# Altium footprint library etherceptor.PcbLib: 98 footprints (part 5 of 7)
Each footprint in its own frame and in the unit in brackets; x right, y up, seen from the top. Pads: shape width x height; smd on the part's side, far side on the other; paste and mask are expansions set on the pad; w line width, h text height; cw(c..) or ccw(c..) is an arc to the next point about the centre after c.
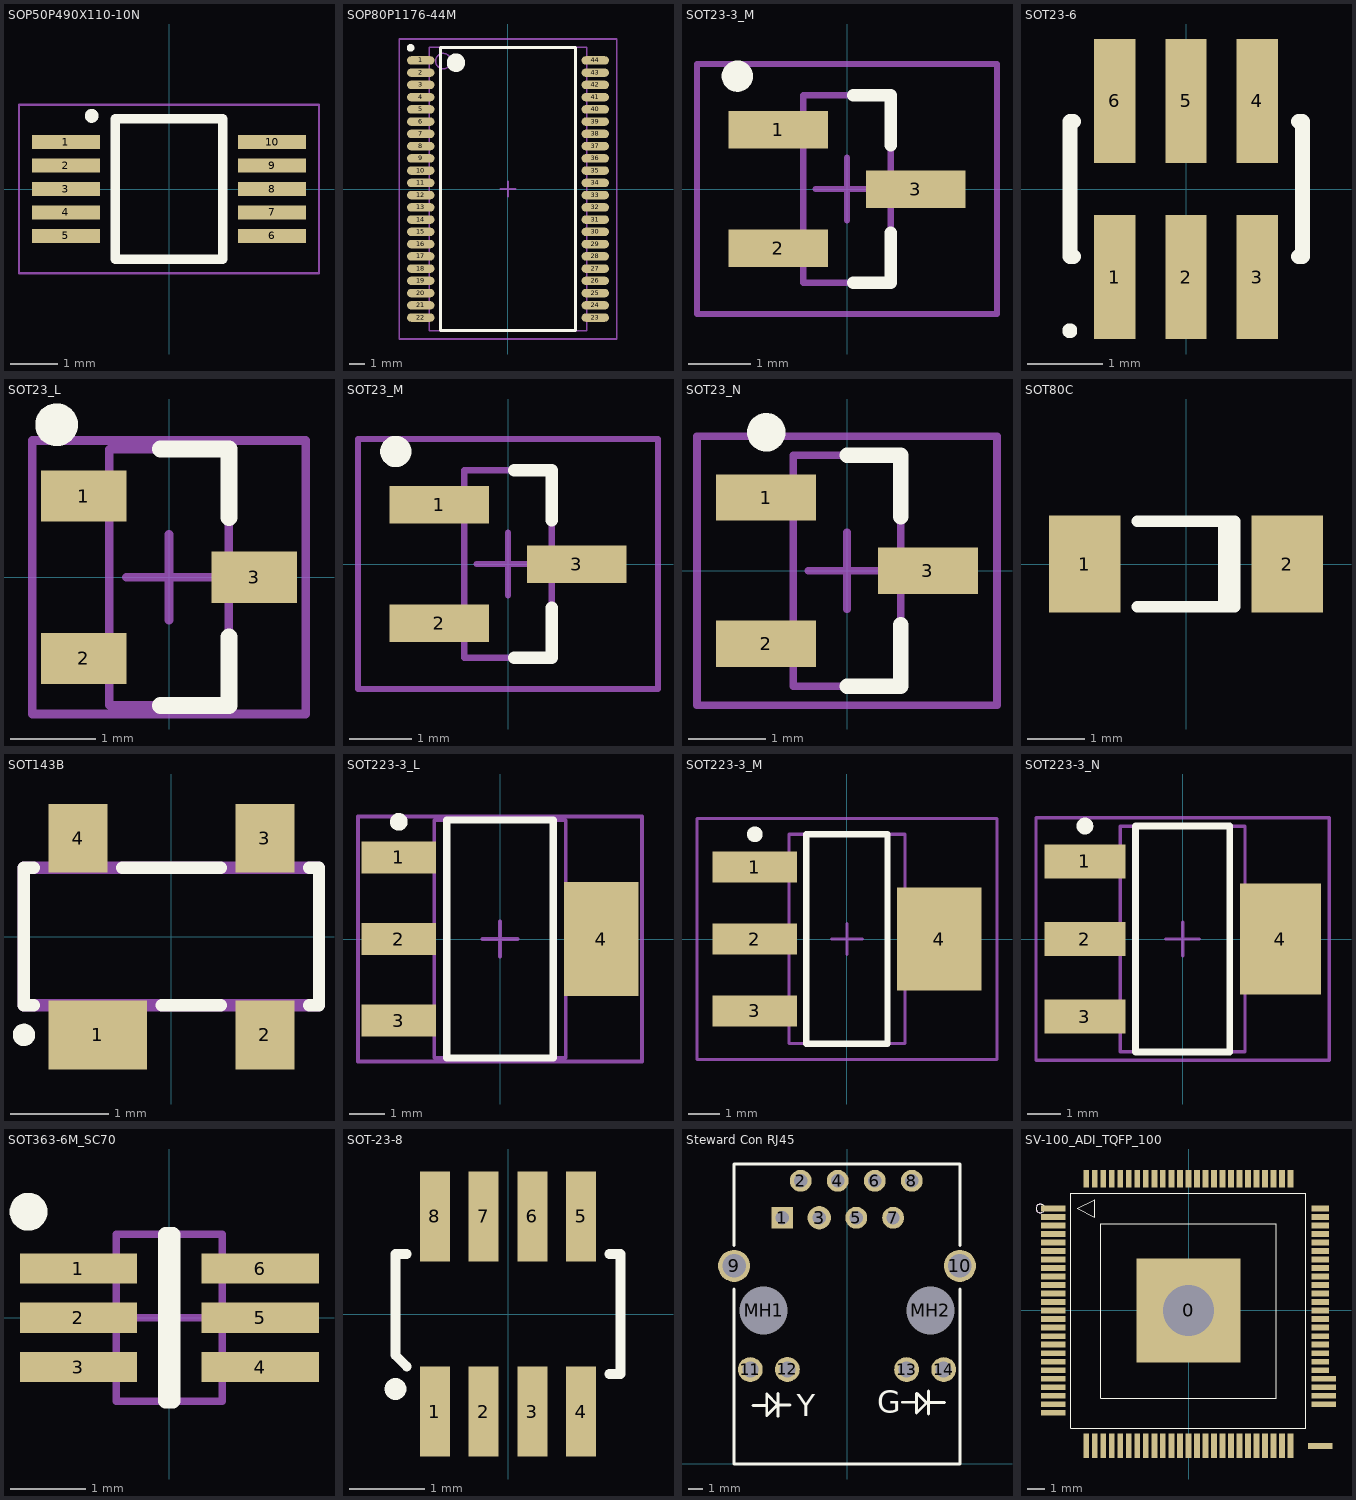
[diagram p4: the footprints below, top view; thin cyan lines are the x and y axes]

## SOP50P490X110-10N [mm]
pads (10):
  rect 1.45x0.3 smd paste-25.4 mask-25.4: 1(-2.2,1) 2(-2.2,0.5) 3(-2.2,0) 4(-2.2,-0.5) 5(-2.2,-1) 6(2.2,-1) 7(2.2,-0.5) 8(2.2,0) 9(2.2,0.5) 10(2.2,1)
Top Overlay:
  circle w0.254: c-1.65,1.56 r0.02
  lines w0.2: -1.15,-1.5 1.15,-1.5 1.15,1.5 -1.15,1.5 -1.15,-1.5
Top Paste:
  region: -2.925,0.85 -1.475,0.85 -1.475,1.15 -2.925,1.15
  region: -2.925,0.35 -1.475,0.35 -1.475,0.65 -2.925,0.65
  region: -2.925,-0.15 -1.475,-0.15 -1.475,0.15 -2.925,0.15
  region: -2.925,-0.65 -1.475,-0.65 -1.475,-0.35 -2.925,-0.35
  region: -2.925,-1.15 -1.475,-1.15 -1.475,-0.85 -2.925,-0.85
  region: 2.925,-0.85 1.475,-0.85 1.475,-1.15 2.925,-1.15
  region: 2.925,-0.35 1.475,-0.35 1.475,-0.65 2.925,-0.65
  region: 2.925,0.15 1.475,0.15 1.475,-0.15 2.925,-0.15
  region: 2.925,0.65 1.475,0.65 1.475,0.35 2.925,0.35
  region: 2.925,1.15 1.475,1.15 1.475,0.85 2.925,0.85
Top Solder:
  region: -3.025,0.75 -1.375,0.75 -1.375,1.25 -3.025,1.25
  region: -3.025,0.25 -1.375,0.25 -1.375,0.75 -3.025,0.75
  region: -3.025,-0.25 -1.375,-0.25 -1.375,0.25 -3.025,0.25
  region: -3.025,-0.75 -1.375,-0.75 -1.375,-0.25 -3.025,-0.25
  region: -3.025,-1.25 -1.375,-1.25 -1.375,-0.75 -3.025,-0.75
  region: 3.025,-0.75 1.375,-0.75 1.375,-1.25 3.025,-1.25
  region: 3.025,-0.25 1.375,-0.25 1.375,-0.75 3.025,-0.75
  region: 3.025,0.25 1.375,0.25 1.375,-0.25 3.025,-0.25
  region: 3.025,0.75 1.375,0.75 1.375,0.25 3.025,0.25
  region: 3.025,1.25 1.375,1.25 1.375,0.75 3.025,0.75
Mechanical 1:
  lines w0.05: -3.2,-1.8 3.2,-1.8 3.2,1.8 -3.2,1.8 -3.2,-1.8
3D body "User Library-MSOP10-1.STEP": height 1.09, standoff 0, extent -2.545,-1.6 2.605,1.6

## SOP80P1176-44M [mm] "SOP, 44-Leads, Body 18.4x10.16mm, Pitch 0.8mm, IPC Low Density"
height 1.2
pads (44):
  oval 1.8x0.55 smd: 1(-5.7,8.4) 2(-5.7,7.6) 3(-5.7,6.8) 4(-5.7,6) 5(-5.7,5.2) 6(-5.7,4.4) 7(-5.7,3.6) 8(-5.7,2.8) 9(-5.7,2) 10(-5.7,1.2) 11(-5.7,0.4) 12(-5.7,-0.4) 13(-5.7,-1.2) 14(-5.7,-2) 15(-5.7,-2.8) 16(-5.7,-3.6) 17(-5.7,-4.4) 18(-5.7,-5.2) 19(-5.7,-6) 20(-5.7,-6.8) 21(-5.7,-7.6) 22(-5.7,-8.4) 23(5.7,-8.4) 24(5.7,-7.6) 25(5.7,-6.8) 26(5.7,-6) 27(5.7,-5.2) 28(5.7,-4.4) 29(5.7,-3.6) 30(5.7,-2.8) 31(5.7,-2) 32(5.7,-1.2) 33(5.7,-0.4) 34(5.7,0.4) 35(5.7,1.2) 36(5.7,2) 37(5.7,2.8) 38(5.7,3.6) 39(5.7,4.4) 40(5.7,5.2) 41(5.7,6) 42(5.7,6.8) 43(5.7,7.6) 44(5.7,8.4)
Top Overlay:
  circle w0.25: c-6.365,9.225 r0.125
  circle w0.6: c-3.4,8.25 r0.3
  lines w0.2: -4.4,-9.25 -4.4,9.25 4.4,9.25 4.4,-9.25 -4.4,-9.25
Mechanical 13:
  circle w0.1: c-4.23,8.36 r0.5
  lines w0.1: -5.13,-9.26 -5.13,9.26 5.13,9.26 5.13,-9.26 -5.13,-9.26
Mechanical 15:
  lines w0.1: -0.5,0 0.5,0 ; 0,-0.5 0,0.5 ; -7.1,-9.8 -7.1,9.8 7.1,9.8 7.1,-9.8 -7.1,-9.8
3D body "SW3dPS-44L-TSOP2.STEP": height 1, standoff -0.1, extent -5.83,-9.21 5.93,9.21

## SOT23-3_M [mm] "SOT23, 3-Leads, Body 2.9x1.3mm, Pitch 0.95mm, Lead Span 2.3mm, IPC Low Density"
height 1.1
pads (3):
  rect 1.6x0.6 smd: 1(-1.1,0.95) 2(-1.1,-0.95) 3(1.1,0)
Top Overlay:
  circle w0.25: c-1.755,1.805 r0.125
  lines w0.2: 0.1,-1.5 0.7,-1.5 0.7,-0.7 ; 0.1,1.5 0.7,1.5 0.7,0.7
Mechanical 13:
  lines w0.1: -0.7,-1.5 -0.7,1.5 0.7,1.5 0.7,-1.5 -0.7,-1.5
Mechanical 15:
  lines w0.1: -0.5,0 0.5,0 ; 0,-0.5 0,0.5 ; -2.4,-2 -2.4,2 2.4,2 2.4,-2 -2.4,-2
3D body "User Library-sot23-3.STEP": height 1, standoff 0, extent -1.22,-1.46 1.12,1.46

## SOT23-6 [mm] "SOT-23/SC-74A; 6 Leads; Body 3 x 3 mm, inc. leads (LxW max)"
height 1.45
pads (6):
  rect 0.55x1.65 smd: 1(-0.95,-1.175) 2(0,-1.175) 3(0.95,-1.175) 4(0.95,1.175) 5(0,1.175) 6(-0.95,1.175)
Top Overlay:
  circle w0.1: c-1.55,-1.89 r0.05
  lines w0.2: -1.5,-0.9 -1.55,-0.9 -1.55,0.9 -1.5,0.9 ; 1.5,-0.9 1.55,-0.9 1.55,0.9 1.5,0.9
3D body "SW3dPS-SOT-23-6.STEP": height 1.09, standoff 0, extent -1.4,-1.213 1.394,1.213

## SOT23_L [mm] "SOT23, 3-Leads, Body 2.9x1.3mm, Pitch 0.95mm, Lead Span 2.3mm, IPC High Density"
height 1.1
pads (3):
  rect 1x0.6 smd: 1(-1,0.95) 2(-1,-0.95) 3(1,0)
Top Overlay:
  circle w0.25: c-1.315,1.785 r0.125
  lines w0.2: -0.1,-1.5 0.7,-1.5 0.7,-0.7 ; -0.1,1.5 0.7,1.5 0.7,0.7
Mechanical 13:
  lines w0.1: -0.7,-1.5 0.7,-1.5 0.7,1.5 -0.7,1.5 -0.7,-1.5
Mechanical 15:
  lines w0.1: -0.5,0 0.5,0 ; 0,-0.5 0,0.5 ; -1.6,-1.6 1.6,-1.6 1.6,1.6 -1.6,1.6 -1.6,-1.6
3D body: height 1.1, standoff 0, extent -0.7,-1.5 0.7,1.5

## SOT23_M [mm] "SOT23, 3-Leads, Body 2.9x1.3mm, Pitch 0.95mm, Lead Span 2.3mm, IPC Low Density"
height 1.1
pads (3):
  rect 1.6x0.6 smd: 1(-1.1,0.95) 2(-1.1,-0.95) 3(1.1,0)
Top Overlay:
  circle w0.25: c-1.795,1.8 r0.125
  lines w0.2: 0.1,-1.5 0.7,-1.5 0.7,-0.7 ; 0.1,1.5 0.7,1.5 0.7,0.7
Mechanical 13:
  lines w0.1: -0.7,-1.5 0.7,-1.5 0.7,1.5 -0.7,1.5 -0.7,-1.5
Mechanical 15:
  lines w0.1: -0.5,0 0.5,0 ; 0,-0.5 0,0.5 ; -2.4,-2 2.4,-2 2.4,2 -2.4,2 -2.4,-2
3D body "User Library-sot23-3.STEP": height 1, standoff 0, extent -1.17,-1.46 1.17,1.46

## SOT23_N [mm] "SOT23, 3-Leads, Body 2.9x1.3mm, Pitch 0.95mm, Lead Span 2.3mm, IPC Medium Density"
height 1.1
pads (3):
  rect 1.3x0.6 smd: 1(-1.05,0.95) 2(-1.05,-0.95) 3(1.05,0)
Top Overlay:
  circle w0.25: c-1.05,1.8 r0.125
  lines w0.2: 0,-1.5 0.7,-1.5 0.7,-0.7 ; 0,1.5 0.7,1.5 0.7,0.7
Mechanical 13:
  lines w0.1: -0.7,-1.5 0.7,-1.5 0.7,1.5 -0.7,1.5 -0.7,-1.5
Mechanical 15:
  lines w0.1: -0.5,0 0.5,0 ; 0,-0.5 0,0.5 ; -1.95,-1.75 1.95,-1.75 1.95,1.75 -1.95,1.75 -1.95,-1.75
3D body: height 1.1, standoff 0, extent -0.7,-1.5 0.7,1.5

## SOT80C [mm] "Metal Electrode Face (MELF) Diode; Body 3.5 x 1.6 mm (LxDia)"
height 1.6
pads (2):
  rect 1.25x1.7 smd: 1(-1.775,0) 2(1.775,0)
Top Overlay:
  lines w0.2: -0.85,-0.75 0.85,-0.75 0.85,0.75 -0.85,0.75 ; 0.66,-0.75 0.66,0.75
3D body "SW3dPS-SOD80.STEP": height 1.61, standoff 0.01, extent -1.85,-0.8 1.85,0.8

## SOT143B [mm]
pads (4):
  rect 1x0.7 smd paste-25.4 mask-25.4: 1(-0.75,-1)
  rect 0.6x0.7 smd paste-25.4 mask-25.4: 2(0.95,-1) 3(0.95,1) 4(-0.95,1)
Top Overlay:
  circle w0.127: c-1.5,-1 r0.05
  lines w0.127: -1.4,-0.7 -1.5,-0.7 -1.5,0.7 -1.4,0.7 ; -0.5,0.7 0.5,0.7 ; -0.1,-0.7 0.5,-0.7 ; 1.4,-0.7 1.5,-0.7 1.5,0.7 1.4,0.7
Top Paste:
  region: -1.25,0.65 -0.65,0.65 -0.65,1.35 -1.25,1.35
  region: 0.65,0.65 1.25,0.65 1.25,1.35 0.65,1.35
  region: 0.65,-1.35 1.25,-1.35 1.25,-0.65 0.65,-0.65
  region: -1.25,-1.35 -0.25,-1.35 -0.25,-0.65 -1.25,-0.65
Top Solder:
  region: -1.35,0.55 -0.55,0.55 -0.55,1.45 -1.35,1.45
  region: 0.55,0.55 1.35,0.55 1.35,1.45 0.55,1.45
  region: 0.55,-1.45 1.35,-1.45 1.35,-0.55 0.55,-0.55
  region: -1.35,-1.45 -0.15,-1.45 -0.15,-0.55 -1.35,-0.55
Mechanical 1:
  lines w0.127: -1.5,-0.7 -1.5,0.7 1.5,0.7 1.5,-0.7 -1.5,-0.7
3D body "User Library-SOT-143.STEP": height 1, standoff 0, extent -1.48,-1.22 1.44,1.2

## SOT223-3_L [mm] "SOT223, 4-Leads, Body 6.5x3.5mm, Pitch 2.3mm, Lead Span 7mm, IPC High Density"
height 1.8
pads (4):
  rect 2.1x0.9 smd: 1(-2.85,2.3) 2(-2.85,0) 3(-2.85,-2.3)
  rect 2.1x3.2 smd: 4(2.85,0)
Top Overlay:
  circle w0.25: c-2.85,3.3 r0.125
  lines w0.2: -1.5,-3.35 -1.5,3.35 1.5,3.35 1.5,-3.35 -1.5,-3.35
Mechanical 13:
  lines w0.1: -1.85,-3.35 -1.85,3.35 1.85,3.35 1.85,-3.35 -1.85,-3.35
Mechanical 15:
  lines w0.1: -0.5,0 0.5,0 ; 0,-0.5 0,0.5 ; -4,-3.45 -4,3.45 4,3.45 4,-3.45 -4,-3.45
3D body: height 1.8, standoff 0, extent -1.85,-3.35 1.85,3.35

## SOT223-3_M [mm] "SOT223, 4-Leads, Body 6.5x3.5mm, Pitch 2.3mm, Lead Span 7mm, IPC Low Density"
height 1.8
pads (4):
  rect 2.7x1 smd: 1(-2.95,2.3) 2(-2.95,0) 3(-2.95,-2.3)
  rect 2.7x3.3 smd: 4(2.95,0)
Top Overlay:
  circle w0.25: c-2.95,3.35 r0.125
  lines w0.2: -1.3,-3.35 -1.3,3.35 1.3,3.35 1.3,-3.35 -1.3,-3.35
Mechanical 13:
  lines w0.1: -1.85,-3.35 -1.85,3.35 1.85,3.35 1.85,-3.35 -1.85,-3.35
Mechanical 15:
  lines w0.1: -0.5,0 0.5,0 ; 0,-0.5 0,0.5 ; -4.8,-3.85 -4.8,3.85 4.8,3.85 4.8,-3.85 -4.8,-3.85
3D body: height 1.8, standoff 0, extent -1.85,-3.35 1.85,3.35

## SOT223-3_N [mm] "SOT223, 4-Leads, Body 6.5x3.5mm, Pitch 2.3mm, Lead Span 7mm, IPC Medium Density"
height 1.8
pads (4):
  rect 2.4x1 smd: 1(-2.9,2.3) 2(-2.9,0) 3(-2.9,-2.3)
  rect 2.4x3.3 smd: 4(2.9,0)
Top Overlay:
  circle w0.25: c-2.9,3.35 r0.125
  lines w0.2: -1.4,-3.35 1.4,-3.35 1.4,3.35 -1.4,3.35 -1.4,-3.35
Mechanical 13:
  lines w0.1: -1.85,-3.35 1.85,-3.35 1.85,3.35 -1.85,3.35 -1.85,-3.35
Mechanical 15:
  lines w0.1: -0.5,0 0.5,0 ; 0,-0.5 0,0.5 ; -4.35,-3.6 4.35,-3.6 4.35,3.6 -4.35,3.6 -4.35,-3.6
3D body "User Library-SOT-223-2.STEP": height 1.85, standoff -0.05, extent -3.615,-3.398 3.59,3.302

## SOT363-6M_SC70 [mm]
pads (6):
  rect 1.55x0.4 smd: 1(-1.2,0.65) 2(-1.2,0) 3(-1.2,-0.65) 4(1.2,-0.65) 5(1.2,0) 6(1.2,0.65)
Top Overlay:
  circle w0.25: c-1.86,1.4 r0.125
  lines w0.2: -0.05,-1.1 0.05,-1.1 0.05,1.1 -0.05,1.1 -0.05,-1.1
Mechanical 13:
  lines w0.1: -0.7,-1.1 -0.7,1.1 0.7,1.1 0.7,-1.1 -0.7,-1.1
Mechanical 15:
  lines w0.1: -0.5,0 0.5,0 ; 0,-0.5 0,0.5
3D body "SW3dPS-SC70-6.STEP": height 0.92, standoff -0.03, extent -1.05,-1 1.05,1

## SOT-23-8 [mm]
pads (8):
  rect 0.4x1.2 smd paste-25.4 mask-25.4: 1(-0.975,-1.3) 2(-0.325,-1.3) 3(0.325,-1.3) 4(0.975,-1.3) 5(0.975,1.3) 6(0.325,1.3) 7(-0.325,1.3) 8(-0.975,1.3)
Top Overlay:
  circle w0.15: c-1.5,-1 r0.07
  lines w0.127: -1.35,-0.7 -1.5,-0.55 -1.5,0.8 -1.35,0.8 ; 1.35,-0.8 1.5,-0.8 1.5,0.8 1.35,0.8
Top Paste:
  region: -0.775,-1.9 -0.775,-0.7 -1.175,-0.7 -1.175,-1.9
  region: -0.125,-1.9 -0.125,-0.7 -0.525,-0.7 -0.525,-1.9
  region: 0.525,-1.9 0.525,-0.7 0.125,-0.7 0.125,-1.9
  region: 1.175,-1.9 1.175,-0.7 0.775,-0.7 0.775,-1.9
  region: 1.175,0.7 1.175,1.9 0.775,1.9 0.775,0.7
  region: 0.525,0.7 0.525,1.9 0.125,1.9 0.125,0.7
  region: -0.125,0.7 -0.125,1.9 -0.525,1.9 -0.525,0.7
  region: -0.775,0.7 -0.775,1.9 -1.175,1.9 -1.175,0.7
Top Solder:
  region: -0.675,-2 -0.675,-0.6 -1.275,-0.6 -1.275,-2
  region: -0.025,-2 -0.025,-0.6 -0.625,-0.6 -0.625,-2
  region: 0.625,-2 0.625,-0.6 0.025,-0.6 0.025,-2
  region: 1.275,-2 1.275,-0.6 0.675,-0.6 0.675,-2
  region: 1.275,0.6 1.275,2 0.675,2 0.675,0.6
  region: 0.625,0.6 0.625,2 0.025,2 0.025,0.6
  region: -0.025,0.6 -0.025,2 -0.625,2 -0.625,0.6
  region: -0.675,0.6 -0.675,2 -1.275,2 -1.275,0.6
3D body "User Library-sot238.step": height 1.2, standoff 0, extent -1.445,-1.4 1.495,1.4

## Steward Con RJ45 [mm] "Connector; PCB Jack, Thru-Hole; 1-Port; Unshielded without Lightpipes; Right Angle"
height 18.92
pads (16):
  rect 1.5x1.5 hole 0.9: 1(-4.445,16.89)
  round 1.5 hole 0.9: 2(-3.175,19.43) 4(-0.635,19.43) 5(0.635,16.89) 6(1.905,19.43) 7(3.168,16.889) 8(4.445,19.43)
  round 1.6 hole 0.9: 3(-1.905,16.89)
  round 2.2 hole 1.6: 9(-7.745,13.59) 10(7.745,13.59)
  round 1.7 hole 1.1: 11(-6.63,6.48) 12(-4.09,6.484) 13(4.09,6.48) 14(6.63,6.48)
  round 2.95 hole 3.3 unplated: MH1(-5.715,10.54) MH2(5.715,10.54)
Top Overlay:
  lines w0.2: -7.75,12 -7.75,0 7.75,0 7.75,12 ; -7.75,15 -7.75,20.58 7.75,20.58 7.75,15 ; -6.443,4.01 -5.532,4.01 ; -4.747,3.277 -4.747,4.845 ; -4.697,4.061 -3.912,4.061 ; 3.807,4.238 4.719,4.238 ; 5.478,4.213 6.693,4.213 ; 5.605,3.442 5.605,4.997 ; -5.507,3.326 -4.798,4.035 -4.798,4.086 -5.507,4.795 -5.507,3.326 ; 4.769,3.504 4.769,4.825 4.814,4.844 5.425,4.233 5.425,4.16 4.769,3.504
  text "G" at 2.086,3.529 h1.52
  text "Y" at -3.431,3.276 h1.52
3D body "User Library-ARJ11B.step": height 13.96, standoff -3.18, extent -8.13,-0.41 8.13,21.18

## SV-100_ADI_TQFP_100 [mm]
pads (101):
  rect 6.1x6.1 hole 3: 0(0,0)
  rect 1.439x0.34 smd: 1(-7.957,5.992) 2(-7.957,5.492) 3(-7.957,4.994) 4(-7.957,4.493) 5(-7.957,3.993) 6(-7.957,3.493) 7(-7.957,2.992) 8(-7.957,2.492) 9(-7.957,1.992) 10(-7.957,1.494) 11(-7.957,0.993) 12(-7.957,0.493) 13(-7.957,-0.007) 14(-7.957,-0.508) 15(-7.957,-1.008) 16(-7.957,-1.509) 17(-7.957,-2.006) 18(-7.957,-2.507) 19(-7.957,-3.007) 20(-7.957,-3.508) 21(-7.957,-4.008) 22(-7.957,-4.508) 23(-7.957,-5.009) 24(-7.957,-5.506) 25(-7.957,-6.007) 51(7.742,-7.957) 52(7.942,-5.506) 53(7.942,-5.009) 54(7.942,-4.508) 55(7.942,-4.008)
  rect 0.34x1.439 smd: 26(-6.007,-7.957) 27(-5.506,-7.957) 28(-5.009,-7.957) 29(-4.508,-7.957) 30(-4.008,-7.957) 31(-3.508,-7.957) 32(-3.007,-7.957) 33(-2.507,-7.957) 34(-2.006,-7.957) 35(-1.509,-7.957) 36(-1.008,-7.957) 37(-0.508,-7.957) 38(-0.007,-7.957) 39(0.493,-7.957) 40(0.993,-7.957) 41(1.494,-7.957) 42(1.992,-7.957) 43(2.492,-7.957) 44(2.992,-7.957) 45(3.493,-7.957) 46(3.993,-7.957) 47(4.493,-7.957) 48(4.994,-7.957) 49(5.492,-7.957) 50(5.992,-7.957)
  rect 1.039x0.34 smd: 56(7.742,-3.508) 57(7.742,-3.007) 58(7.742,-2.507) 59(7.742,-2.006) 60(7.742,-1.509) 61(7.742,-1.008) 62(7.742,-0.508) 63(7.742,-0.007) 64(7.742,0.493) 65(7.742,0.993) 66(7.742,1.494) 67(7.742,1.992) 68(7.742,2.492) 69(7.742,2.992) 70(7.742,3.493) 71(7.742,3.993) 72(7.742,4.493) 73(7.742,4.994) 74(7.742,5.492) 75(7.742,5.992)
  rect 0.34x1.039 smd: 76(5.992,7.742) 77(5.492,7.742) 78(4.994,7.742) 79(4.493,7.742) 80(3.993,7.742) 81(3.493,7.742) 82(2.992,7.742) 83(2.492,7.742) 84(1.992,7.742) 85(1.494,7.742) 86(0.993,7.742) 87(0.493,7.742) 88(-0.007,7.742) 89(-0.508,7.742) 90(-1.008,7.742) 91(-1.509,7.742) 92(-2.006,7.742) 93(-2.507,7.742) 94(-3.007,7.742) 95(-3.508,7.742) 96(-4.008,7.742) 97(-4.508,7.742) 98(-5.009,7.742) 99(-5.506,7.742) 100(-6.007,7.742)
Top Overlay:
  lines w0.01: -8.958,5.993 ccw(c-8.708,5.993) -8.458,5.993 ccw(c-8.708,5.993) -8.958,5.993 ; -6.909,-6.909 6.894,-6.909 6.894,6.894 -6.909,6.894 -6.909,-6.909 ; -6.528,5.992 -5.506,6.503 -5.506,5.482 -6.528,5.992 ; -5.159,-5.161 5.154,-5.161 5.154,5.083 -5.159,5.083 -5.159,-5.161
Mechanical 16:
  lines w0.01: -8.958,5.993 ccw(c-8.708,5.993) -8.458,5.993 ccw(c-8.708,5.993) -8.958,5.993